# Altium footprint library 15-LEDs+LCD.PcbLib: 116 footprints (part 2 of 8) (continued)
## DS_EA_DOGXL160B-7 [mm] "160x104-Pixel  LCD Graphic Display With Blue Background" (continued)
3D body "DS_EA_DOGXL160B-7.stp": height 6.44, standoff -3.07, extent -39,-30.655 39,30.655

## DS_EA_LED78X64-W [mm] "White LED Backlight for 60x104-Pixel  LCD Graphic Display"
height 3.8
Top Overlay:
  lines w0.2: -39,-27.55 39,-27.55 ; -39,27.55 39,27.55 ; -39,28.55 39,28.55 ; -38.95,-28.55 39.05,-28.55 ; -39,-32 -39,32 39,32 39,-32 -39,-32
Mechanical 8:
  lines w0.1: -19.55,-30.48 -19.05,-30.48 ; -19.55,30.48 -19.05,30.48 ; -19.05,-30.98 -19.05,-30.48 ; -19.05,-29.98 -19.05,-30.48 ; -19.05,29.98 -19.05,30.48 ; -19.05,30.98 -19.05,30.48 ; -18.55,-30.48 -19.05,-30.48 ; -18.55,30.48 -19.05,30.48 ; -17.01,-30.48 -16.51,-30.48 ; -17.01,30.48 -16.51,30.48 ; -16.51,-30.98 -16.51,-30.48 ; -16.51,-29.98 -16.51,-30.48 ; -16.51,29.98 -16.51,30.48 ; -16.51,30.98 -16.51,30.48 ; -16.01,-30.48 -16.51,-30.48 ; -16.01,30.48 -16.51,30.48 ; -14.47,-30.48 -13.97,-30.48 ; -14.47,30.48 -13.97,30.48 ; -13.97,-30.98 -13.97,-30.48 ; -13.97,-29.98 -13.97,-30.48 ; -13.97,29.98 -13.97,30.48 ; -13.97,30.98 -13.97,30.48 ; -13.47,-30.48 -13.97,-30.48 ; -13.47,30.48 -13.97,30.48 ; -11.93,30.48 -11.43,30.48 ; -11.43,29.98 -11.43,30.48 ; -11.43,30.98 -11.43,30.48 ; -10.93,30.48 -11.43,30.48 ; -9.39,30.48 -8.89,30.48 ; -8.89,29.98 -8.89,30.48 ; -8.89,30.98 -8.89,30.48 ; -8.39,30.48 -8.89,30.48 ; -6.85,30.48 -6.35,30.48 ; -6.35,29.98 -6.35,30.48 ; -6.35,30.98 -6.35,30.48 ; -5.85,30.48 -6.35,30.48 ; -4.31,30.48 -3.81,30.48 ; -3.81,29.98 -3.81,30.48 ; -3.81,30.98 -3.81,30.48 ; -3.31,30.48 -3.81,30.48 ; -1.77,30.48 -1.27,30.48 ; -1.27,29.98 -1.27,30.48 ; -1.27,30.98 -1.27,30.48 ; -0.77,30.48 -1.27,30.48 ; -0.5,0 0,0 ; 0,-0.5 0,0 ; 0,0.5 0,0 ; 0.5,0 0,0 ; 0.77,30.48 1.27,30.48 ; 1.27,29.98 1.27,30.48 ; 1.27,30.98 1.27,30.48 ; 1.77,30.48 1.27,30.48 ; 3.31,30.48 3.81,30.48 ; 3.81,29.98 3.81,30.48 ; 3.81,30.98 3.81,30.48 ; 4.31,30.48 3.81,30.48 ; 5.85,30.48 6.35,30.48 ; 6.35,29.98 6.35,30.48 ; 6.35,30.98 6.35,30.48 ; 6.85,30.48 6.35,30.48 ; 8.39,30.48 8.89,30.48 ; 8.89,29.98 8.89,30.48 ; 8.89,30.98 8.89,30.48 ; 9.39,30.48 8.89,30.48 ; 10.93,30.48 11.43,30.48 ; 11.43,29.98 11.43,30.48 ; 11.43,30.98 11.43,30.48 ; 11.93,30.48 11.43,30.48 ; 13.47,-30.48 13.97,-30.48 ; 13.47,30.48 13.97,30.48 ; 13.97,-30.98 13.97,-30.48 ; 13.97,-29.98 13.97,-30.48 ; 13.97,29.98 13.97,30.48 ; 13.97,30.98 13.97,30.48 ; 14.47,-30.48 13.97,-30.48 ; 14.47,30.48 13.97,30.48 ; 16.01,-30.48 16.51,-30.48 ; 16.01,30.48 16.51,30.48 ; 16.51,-30.98 16.51,-30.48 ; 16.51,-29.98 16.51,-30.48 ; 16.51,29.98 16.51,30.48 ; 16.51,30.98 16.51,30.48 ; 17.01,-30.48 16.51,-30.48 ; 17.01,30.48 16.51,30.48 ; 18.55,-30.48 19.05,-30.48 ; 18.55,30.48 19.05,30.48 ; 19.05,-30.98 19.05,-30.48 ; 19.05,-29.98 19.05,-30.48 ; 19.05,29.98 19.05,30.48 ; 19.05,30.98 19.05,30.48 ; 19.55,-30.48 19.05,-30.48 ; 19.55,30.48 19.05,30.48
Mechanical 14:
  lines w0.1: -39,-27.55 39,-27.55 ; -39,27.55 39,27.55 ; -39,28.55 39,28.55 ; -38.95,-28.55 39.05,-28.55 ; -39,-32 -39,32 39,32 39,-32 -39,-32
3D body "DS_EA_LED78X64-W.stp": height 3.63, standoff 0, extent -39,-32 39,32

## DS_EA_TOUCH160-1 [mm] "Touch Panel For DOGXL160  LCD Graphic Display"
height 1.6
Top Overlay:
  lines w0.2: -26.5,30.67 -26.5,31.929 -25.484,31.33 -22.769,32.478 -21.6,31.929 -21.6,30.67 ; -20.4,30.67 -39,30.67 -39,-29.33 39,-29.33 39,30.67 20.4,30.67 ; -36.5,-25.83 -36.5,20.17 36.5,20.17 36.5,-25.83 -36.5,-25.83 ; -35,-24.58 35,-24.58 35,18.92 -35,18.92 -35,-24.58
Mechanical 8:
  lines w0.1: -35,-24.58 0,-2.83 ; -35,18.92 0,-2.83 ; -24.05,29.17 -24.05,30.17 ; -24.05,30.67 -24.05,31.17 ; -24.05,31.67 -24.05,32.67 ; -24.05,33.17 -24.05,33.67 ; -19.55,-30.48 -19.05,-30.48 ; -19.55,30.48 -19.05,30.48 ; -19.05,-30.98 -19.05,-30.48 ; -19.05,-29.98 -19.05,-30.48 ; -19.05,29.98 -19.05,30.48 ; -19.05,30.98 -19.05,30.48 ; -18.55,-30.48 -19.05,-30.48 ; -18.55,30.48 -19.05,30.48 ; -17.01,-30.48 -16.51,-30.48 ; -17.01,30.48 -16.51,30.48 ; -16.51,-30.98 -16.51,-30.48 ; -16.51,-29.98 -16.51,-30.48 ; -16.51,29.98 -16.51,30.48 ; -16.51,30.98 -16.51,30.48 ; -16.01,-30.48 -16.51,-30.48 ; -16.01,30.48 -16.51,30.48 ; -14.47,-30.48 -13.97,-30.48 ; -14.47,30.48 -13.97,30.48 ; -13.97,-30.98 -13.97,-30.48 ; -13.97,-29.98 -13.97,-30.48 ; -13.97,29.98 -13.97,30.48 ; -13.97,30.98 -13.97,30.48 ; -13.47,-30.48 -13.97,-30.48 ; -13.47,30.48 -13.97,30.48 ; -11.93,30.48 -11.43,30.48 ; -11.43,29.98 -11.43,30.48 ; -11.43,30.98 -11.43,30.48 ; -10.93,30.48 -11.43,30.48 ; -9.39,30.48 -8.89,30.48 ; -8.89,29.98 -8.89,30.48 ; -8.89,30.98 -8.89,30.48 ; -8.39,30.48 -8.89,30.48 ; -6.85,30.48 -6.35,30.48 ; -6.35,29.98 -6.35,30.48 ; -6.35,30.98 -6.35,30.48 ; -5.85,30.48 -6.35,30.48 ; -4.31,30.48 -3.81,30.48 ; -3.81,29.98 -3.81,30.48 ; -3.81,30.98 -3.81,30.48 ; -3.31,30.48 -3.81,30.48 ; -1.77,30.48 -1.27,30.48 ; -1.27,29.98 -1.27,30.48 ; -1.27,30.98 -1.27,30.48 ; -0.77,30.48 -1.27,30.48 ; -0.5,0 0,0 ; 0,-0.5 0,0 ; 0,0.5 0,0 ; 0.5,0 0,0 ; 0.77,30.48 1.27,30.48 ; 1.27,29.98 1.27,30.48 ; 1.27,30.98 1.27,30.48 ; 1.77,30.48 1.27,30.48 ; 3.31,30.48 3.81,30.48 ; 3.81,29.98 3.81,30.48 ; 3.81,30.98 3.81,30.48 ; 4.31,30.48 3.81,30.48 ; 5.85,30.48 6.35,30.48 ; 6.35,29.98 6.35,30.48 ; 6.35,30.98 6.35,30.48 ; 6.85,30.48 6.35,30.48 ; 8.39,30.48 8.89,30.48 ; 8.89,29.98 8.89,30.48 ; 8.89,30.98 8.89,30.48 ; 9.39,30.48 8.89,30.48 ; 10.93,30.48 11.43,30.48 ; 11.43,29.98 11.43,30.48 ; 11.43,30.98 11.43,30.48 ; 11.93,30.48 11.43,30.48 ; 13.47,-30.48 13.97,-30.48 ; 13.47,30.48 13.97,30.48 ; 13.97,-30.98 13.97,-30.48 ; 13.97,-29.98 13.97,-30.48 ; 13.97,29.98 13.97,30.48 ; 13.97,30.98 13.97,30.48 ; 14.47,-30.48 13.97,-30.48 ; 14.47,30.48 13.97,30.48 ; 16.01,-30.48 16.51,-30.48 ; 16.01,30.48 16.51,30.48 ; 16.51,-30.98 16.51,-30.48 ; 16.51,-29.98 16.51,-30.48 ; 16.51,29.98 16.51,30.48 ; 16.51,30.98 16.51,30.48 ; 17.01,-30.48 16.51,-30.48 ; 17.01,30.48 16.51,30.48 ; 18.55,-30.48 19.05,-30.48 ; 18.55,30.48 19.05,30.48 ; 19.05,-30.98 19.05,-30.48 ; 19.05,-29.98 19.05,-30.48 ; 19.05,29.98 19.05,30.48 ; 19.05,30.98 19.05,30.48 ; 19.55,-30.48 19.05,-30.48 ; 19.55,30.48 19.05,30.48 ; 35,-24.58 0,-2.83 ; 35,18.92 0,-2.83
Mechanical 14:
  lines w0.1: -26.5,30.67 -26.5,31.929 -25.484,31.33 -22.769,32.478 -21.6,31.929 -21.6,30.67 ; -39,-29.33 -39,30.67 39,30.67 39,-29.33 -39,-29.33 ; -36.5,-25.83 -36.5,20.17 36.5,20.17 36.5,-25.83 -36.5,-25.83 ; -35,-24.58 35,-24.58 35,18.92 -35,18.92 -35,-24.58
3D body "DS_EA_TOUCH160-1.stp": height 8.04, standoff 6.44, extent -39,-29.33 39,36.393

## DS_KINGBRIGHT_SA52-11SRWA [mm] "13.2mm Single Digit Numeric Red Display, Body 12.65x17.75mm"
height 7.25
pads (10):
  round 1.3 hole 0.8: 1(-5.08,-7.62) 2(-2.54,-7.62) 3(0,-7.62) 4(2.54,-7.62) 5(5.08,-7.62) 6(5.08,7.62) 7(2.54,7.62) 8(0,7.62) 9(-2.54,7.62) 10(-5.08,7.62)
Top Overlay:
  circle w0.2: c4.735,-5.9 r0.7
  lines w0.2: -6.325,-8.875 6.325,-8.875 6.325,8.875 -6.325,8.875 -6.325,-8.875 ; -4.982,-5.615 -4.101,-0.617 -3.508,-0.12 -2.751,-1.021 -3.454,-5.008 -4.649,-6.012 -4.982,-5.615 ; -4.489,-6.203 -4.156,-6.6 1.582,-6.6 2.073,-6.188 1.244,-5.2 -3.293,-5.2 -4.489,-6.203 ; -3.883,0.617 -3.002,5.615 -2.511,6.027 -1.682,5.039 -2.377,1.095 -3.472,0.127 -3.883,0.617 ; -3.264,-0.022 -2.694,-0.7 2.2,-0.7 3.017,0.022 2.447,0.7 -2.447,0.7 -3.264,-0.022 ; -2.32,6.188 -1.491,5.2 3.046,5.2 4.242,6.203 3.909,6.6 -1.828,6.6 -2.32,6.188 ; 1.435,-5.039 2.131,-1.095 3.225,-0.127 3.636,-0.617 2.755,-5.615 2.264,-6.027 1.435,-5.039 ; 2.504,1.021 3.207,5.008 4.403,6.012 4.735,5.615 3.854,0.617 3.261,0.12 2.504,1.021
Mechanical 8:
  lines w0.1: -5.53,-7.62 -5.08,-7.62 -5.08,-8.07 ; -5.53,7.62 -5.08,7.62 -5.08,7.17 ; -2.99,-7.62 -2.54,-7.62 -2.54,-8.07 ; -2.99,7.62 -2.54,7.62 -2.54,7.17 ; -1,0 1,0 ; -0.45,-7.62 0,-7.62 0,-8.07 ; -0.45,7.62 0,7.62 0,7.17 ; 0,-1 0,1 ; 2.09,-7.62 2.54,-7.62 2.54,-8.07 ; 2.09,7.62 2.54,7.62 2.54,7.17 ; 4.63,-7.62 5.08,-7.62 5.08,-8.07 ; 4.63,7.62 5.08,7.62 5.08,7.17 ; -5.33,-7.745 -4.83,-7.745 -4.83,-7.495 -5.33,-7.495 -5.33,-7.745 ; -5.33,7.495 -4.83,7.495 -4.83,7.745 -5.33,7.745 -5.33,7.495 ; -2.79,-7.745 -2.29,-7.745 -2.29,-7.495 -2.79,-7.495 -2.79,-7.745 ; -2.79,7.495 -2.29,7.495 -2.29,7.745 -2.79,7.745 -2.79,7.495 ; -0.25,-7.745 0.25,-7.745 0.25,-7.495 -0.25,-7.495 -0.25,-7.745 ; -0.25,7.495 0.25,7.495 0.25,7.745 -0.25,7.745 -0.25,7.495 ; 2.29,-7.745 2.79,-7.745 2.79,-7.495 2.29,-7.495 2.29,-7.745 ; 2.29,7.495 2.79,7.495 2.79,7.745 2.29,7.745 2.29,7.495 ; 4.83,-7.745 5.33,-7.745 5.33,-7.495 4.83,-7.495 4.83,-7.745 ; 4.83,7.495 5.33,7.495 5.33,7.745 4.83,7.745 4.83,7.495
Mechanical 14:
  circle w0.1: c4.735,-5.9 r0.7
  lines w0.1: -6.325,-8.875 6.325,-8.875 6.325,8.875 -6.325,8.875 -6.325,-8.875 ; -4.982,-5.615 -4.101,-0.617 -3.508,-0.12 -2.751,-1.021 -3.454,-5.008 -4.649,-6.012 -4.982,-5.615 ; -4.489,-6.203 -4.156,-6.6 1.582,-6.6 2.073,-6.188 1.244,-5.2 -3.293,-5.2 -4.489,-6.203 ; -3.883,0.617 -3.002,5.615 -2.511,6.027 -1.682,5.039 -2.377,1.095 -3.472,0.127 -3.883,0.617 ; -3.264,-0.022 -2.694,-0.7 2.2,-0.7 3.017,0.022 2.447,0.7 -2.447,0.7 -3.264,-0.022 ; -2.32,6.188 -1.491,5.2 3.046,5.2 4.242,6.203 3.909,6.6 -1.828,6.6 -2.32,6.188 ; 1.435,-5.039 2.131,-1.095 3.225,-0.127 3.636,-0.617 2.755,-5.615 2.264,-6.027 1.435,-5.039 ; 2.504,1.021 3.207,5.008 4.403,6.012 4.735,5.615 3.854,0.617 3.261,0.12 2.504,1.021
3D body "DS_KINGBRIGHT_SA52-11SRWA.stp": height 7.1, standoff -3.6, extent -6.325,-8.875 6.325,8.875

## DS_LASCAR_DPM160_a [mm] "4?Digit LCD Voltmeter With 12.5mm (0.5\") Digit Height"
height 13.6
Top Overlay:
  lines w0.2: -22.65,-8.15 -22.65,8.15 22.65,8.15 22.65,-8.15 ; -26,-12.5 -26,12.5 26,12.5 26,-12.5 -26,-12.5
  text "20" at -24.825,-10.175 h1
  text "1" at 23.942,-10.16 h1
Mechanical 8:
  lines w0.1: -24.63,-7.82 -24.13,-7.82 ; -24.13,-8.32 -24.13,-7.82 ; -24.13,-7.32 -24.13,-7.82 ; -23.63,-7.82 -24.13,-7.82 ; -22.09,-7.82 -21.59,-7.82 ; -21.59,-8.32 -21.59,-7.82 ; -21.59,-7.32 -21.59,-7.82 ; -21.09,-7.82 -21.59,-7.82 ; -19.55,-7.82 -19.05,-7.82 ; -19.05,-8.32 -19.05,-7.82 ; -19.05,-7.32 -19.05,-7.82 ; -18.55,-7.82 -19.05,-7.82 ; -17.01,-7.82 -16.51,-7.82 ; -16.51,-8.32 -16.51,-7.82 ; -16.51,-7.32 -16.51,-7.82 ; -16.01,-7.82 -16.51,-7.82 ; -14.47,-7.82 -13.97,-7.82 ; -13.97,-8.32 -13.97,-7.82 ; -13.97,-7.32 -13.97,-7.82 ; -13.47,-7.82 -13.97,-7.82 ; -11.93,-7.82 -11.43,-7.82 ; -11.43,-8.32 -11.43,-7.82 ; -11.43,-7.32 -11.43,-7.82 ; -10.93,-7.82 -11.43,-7.82 ; -9.39,-7.82 -8.89,-7.82 ; -8.89,-8.32 -8.89,-7.82 ; -8.89,-7.32 -8.89,-7.82 ; -8.39,-7.82 -8.89,-7.82 ; -6.85,-7.82 -6.35,-7.82 ; -6.35,-8.32 -6.35,-7.82 ; -6.35,-7.32 -6.35,-7.82 ; -5.85,-7.82 -6.35,-7.82 ; -4.31,-7.82 -3.81,-7.82 ; -3.81,-8.32 -3.81,-7.82 ; -3.81,-7.32 -3.81,-7.82 ; -3.31,-7.82 -3.81,-7.82 ; -1.77,-7.82 -1.27,-7.82 ; -1.27,-8.32 -1.27,-7.82 ; -1.27,-7.32 -1.27,-7.82 ; -0.77,-7.82 -1.27,-7.82 ; -0.5,0 0,0 ; 0,-0.5 0,0 ; 0,0.5 0,0 ; 0.5,0 0,0 ; 0.77,-7.82 1.27,-7.82 ; 1.27,-8.32 1.27,-7.82 ; 1.27,-7.32 1.27,-7.82 ; 1.77,-7.82 1.27,-7.82 ; 3.31,-7.82 3.81,-7.82 ; 3.81,-8.32 3.81,-7.82 ; 3.81,-7.32 3.81,-7.82 ; 4.31,-7.82 3.81,-7.82 ; 5.85,-7.82 6.35,-7.82 ; 6.35,-8.32 6.35,-7.82 ; 6.35,-7.32 6.35,-7.82 ; 6.85,-7.82 6.35,-7.82 ; 8.39,-7.82 8.89,-7.82 ; 8.89,-8.32 8.89,-7.82 ; 8.89,-7.32 8.89,-7.82 ; 9.39,-7.82 8.89,-7.82 ; 10.93,-7.82 11.43,-7.82 ; 11.43,-8.32 11.43,-7.82 ; 11.43,-7.32 11.43,-7.82 ; 11.93,-7.82 11.43,-7.82 ; 13.47,-7.82 13.97,-7.82 ; 13.97,-8.32 13.97,-7.82 ; 13.97,-7.32 13.97,-7.82 ; 14.47,-7.82 13.97,-7.82 ; 16.01,-7.82 16.51,-7.82 ; 16.51,-8.32 16.51,-7.82 ; 16.51,-7.32 16.51,-7.82 ; 17.01,-7.82 16.51,-7.82 ; 18.55,-7.82 19.05,-7.82 ; 19.05,-8.32 19.05,-7.82 ; 19.05,-7.32 19.05,-7.82 ; 19.55,-7.82 19.05,-7.82 ; 21.09,-7.82 21.59,-7.82 ; 21.59,-8.32 21.59,-7.82 ; 21.59,-7.32 21.59,-7.82 ; 22.09,-7.82 21.59,-7.82 ; 23.63,-7.82 24.13,-7.82 ; 24.13,-8.32 24.13,-7.82 ; 24.13,-7.32 24.13,-7.82 ; 24.63,-7.82 24.13,-7.82
Mechanical 14:
  lines w0.1: -22.7,6 -22.7,5 -21.7,5 ; -22.7,6.551 -24.3,6.551 -24.3,8.249 -22.7,8.249 ; -22.7,6.9 -22.7,7.9 ; -22.7,8.8 -22.7,9.8 -21.7,9.8 ; -20.7,5 -19.7,5 ; -20.7,9.8 -19.7,9.8 ; -18.7,5 -17.7,5 ; -18.7,9.8 -17.7,9.8 ; -16.7,5 -15.7,5 ; -16.7,9.8 -15.7,9.8 ; -14.7,5 -13.7,5 ; -14.7,9.8 -13.7,9.8 ; -12.7,5 -11.7,5 ; -12.7,9.8 -11.7,9.8 ; -10.7,5 -9.7,5 ; -10.7,9.8 -9.7,9.8 ; -8.7,5 -7.7,5 ; -8.7,9.8 -7.7,9.8 ; -6.7,5 -5.7,5 ; -6.7,9.8 -5.7,9.8 ; -5,5 -4,5 -4,6 ; -5,9.8 -4,9.8 -4,8.8 ; -4,6.9 -4,7.9 ; -26,-12.5 26,-12.5 ; -26,-12.5 -26,12.5 ; -26,-12.5 -26,12.5 ; -26,-12.5 26,-12.5 ; -26,12.5 26,12.5 ; -26,12.5 26,12.5 ; -22.65,-8.15 22.65,-8.15 ; -22.65,-8.15 -22.65,8.15 22.65,8.15 22.65,-8.15 ; -22.65,-8.15 22.65,-8.15 ; 26,-12.5 26,12.5 ; 26,-12.5 26,12.5
  text "20" at -24.825,-10.175 h1
  text "1" at 23.942,-10.16 h1
3D body "DS_LASCAR_DPM160.stp": height 13.3, standoff -1.6, extent -26,-12.5 26,12.5

## DS_LASCAR_OEM 1L-LED [mm] "3?Digit LED, 8mm Digit Height, Body 23.4x19.5mm, DIL Pin Connection"
height 5.4
pads (13):
  round 1.3 hole 0.8: 1(-6.35,-6.35) 2(-3.81,-6.35) 3(-1.27,-6.35) 4(1.27,-6.35) 5(3.81,-6.35) 6(6.35,-6.35) 7(6.35,6.35) 8(3.81,6.35) 9(1.27,6.35) 10(-1.27,6.35) 11(-3.81,6.35) 12(-6.35,6.35)
  round 1 hole 2 unplated mask+0.6: 13(6.7,-2.7)
Top Overlay:
  circle w0.3: c-6.38,-8.7 r0.15
  circle w0.3: c-0.25,-3.8 r0.15
  circle w0.3: c4.925,-3.8 r0.15
  circle w0.3: c-5.425,-3.8 r0.15
  region: -6.638,-3.4 -6.451,-0.4 -6.05,-0.4 -6.238,-3.4
  region: -4.538,-3.4 -4.137,-3.4 -3.949,-0.4 -4.35,-0.4
  region: -1.463,-3.4 -1.062,-3.4 -0.875,-0.4 -1.276,-0.4
  region: -4.174,-4 -4.149,-3.6 -1.476,-3.6 -1.501,-4
  region: -3.937,-0.2 -3.912,0.2 -1.238,0.2 -1.263,-0.2
  region: -9.112,-0.2 -9.087,0.2 -6.413,0.2 -6.438,-0.2
  region: -6.401,0.4 -6,0.4 -5.813,3.4 -6.213,3.4
  region: -4.113,3.4 -3.712,3.4 -3.899,0.4 -4.3,0.4
  region: -3.699,3.6 -3.674,4 -1.001,4 -1.026,3.6
  region: -1.038,3.4 -0.637,3.4 -0.825,0.4 -1.226,0.4
  region: 0.875,0.4 1.276,0.4 1.463,3.4 1.062,3.4
  region: 1.476,3.6 4.149,3.6 4.174,4 1.501,4
  region: 1.263,0.2 3.937,0.2 3.912,-0.2 1.238,-0.2
  region: 0.825,-0.4 1.226,-0.4 1.038,-3.4 0.637,-3.4
  region: 1.026,-3.6 3.699,-3.6 3.674,-4 1.001,-4
  region: 3.712,-3.4 4.113,-3.4 4.3,-0.4 3.899,-0.4
  region: 6,-0.4 6.401,-0.4 6.327,-1.578 5.926,-1.58
  region: 7.45,-3.6 8.874,-3.6 8.849,-4 7.4,-4
  region: 8.887,-3.4 9.288,-3.4 9.475,-0.4 9.074,-0.4
  region: 6.413,-0.2 6.438,0.2 9.112,0.2 9.087,-0.2
  region: 9.124,0.4 9.525,0.4 9.713,3.4 9.312,3.4
  region: 6.651,3.6 6.676,4 9.349,4 9.324,3.6
  region: 6.238,3.4 6.638,3.4 6.451,0.4 6.05,0.4
  region: 4.137,3.4 4.538,3.4 4.35,0.4 3.949,0.4
  lines w0.2: -11.7,-8.2 11.7,-8.2 11.7,8.2 -11.7,8.2 -11.7,-8.2
Mechanical 8:
  drawing of 237 lines, arcs and shapes, not listed
Mechanical 14:
  circle w0.3: c-5.425,-3.8 r0.15
  circle w0.3: c4.925,-3.8 r0.15
  circle w0.3: c-0.25,-3.8 r0.15
  region: -6.638,-3.4 -6.451,-0.4 -6.05,-0.4 -6.238,-3.4
  region: -4.538,-3.4 -4.137,-3.4 -3.949,-0.4 -4.35,-0.4
  region: -1.463,-3.4 -1.062,-3.4 -0.875,-0.4 -1.276,-0.4
  region: -4.174,-4 -4.149,-3.6 -1.476,-3.6 -1.501,-4
  region: -3.937,-0.2 -3.912,0.2 -1.238,0.2 -1.263,-0.2
  region: -9.112,-0.2 -9.087,0.2 -6.413,0.2 -6.438,-0.2
  region: -6.401,0.4 -6,0.4 -5.813,3.4 -6.213,3.4
  region: -4.113,3.4 -3.712,3.4 -3.899,0.4 -4.3,0.4
  region: -3.699,3.6 -3.674,4 -1.001,4 -1.026,3.6
  region: -1.038,3.4 -0.637,3.4 -0.825,0.4 -1.226,0.4
  region: 0.875,0.4 1.276,0.4 1.463,3.4 1.062,3.4
  region: 1.476,3.6 4.149,3.6 4.174,4 1.501,4
  region: 1.263,0.2 3.937,0.2 3.912,-0.2 1.238,-0.2
  region: 0.825,-0.4 1.226,-0.4 1.038,-3.4 0.637,-3.4
  region: 1.026,-3.6 3.699,-3.6 3.674,-4 1.001,-4
  region: 3.712,-3.4 4.113,-3.4 4.3,-0.4 3.899,-0.4
  region: 6,-0.4 6.401,-0.4 6.213,-3.4 5.813,-3.4
  region: 6.201,-3.6 8.874,-3.6 8.849,-4 6.176,-4
  region: 8.887,-3.4 9.288,-3.4 9.475,-0.4 9.074,-0.4
  region: 6.413,-0.2 6.438,0.2 9.112,0.2 9.087,-0.2
  region: 9.124,0.4 9.525,0.4 9.713,3.4 9.312,3.4
  region: 6.651,3.6 6.676,4 9.349,4 9.324,3.6
  region: 6.238,3.4 6.638,3.4 6.451,0.4 6.05,0.4
  region: 4.137,3.4 4.538,3.4 4.35,0.4 3.949,0.4
  lines w0.1: -11.7,-8.2 11.7,-8.2 11.7,8.2 -11.7,8.2 -11.7,-8.2
3D body "DS_LASCAR_OEM 1L-LED.stp": height 5.4, standoff -3.1, extent -11.7,-8.2 11.7,8.2

## DS_MURATA_DMS-40LCD-1/2-5-C [mm] "4 1/2 Digit, LCD Display Digital Panel Voltmeters, Body 55.1x23.4mm"
height 10.92
pads (13):
  round 1.8 hole 1.1: 1(-22.85,6.35) 2(-22.85,3.81) 3(-22.85,1.27) 4(-22.85,-1.27) 5(-22.85,-3.81) 6(-22.85,-6.35) 7(22.85,-6.35) 8(22.85,-3.81) 9(22.85,-1.27) 10(22.85,1.27) 11(22.85,3.81) 12(22.85,6.35)
  round 1 hole 3.2 unplated mask+1.1: 13(14.59,1.02)
Top Overlay:
  drawing of 191 lines, arcs and shapes, not listed
Mechanical 8:
  lines w0.1: -23.35,-6.35 -22.85,-6.35 ; -23.35,-3.81 -22.85,-3.81 ; -23.35,-1.27 -22.85,-1.27 ; -23.35,1.27 -22.85,1.27 ; -23.35,3.81 -22.85,3.81 ; -23.35,6.35 -22.85,6.35 ; -22.85,-6.85 -22.85,-6.35 ; -22.85,-5.85 -22.85,-6.35 ; -22.85,-4.31 -22.85,-3.81 ; -22.85,-3.31 -22.85,-3.81 ; -22.85,-1.77 -22.85,-1.27 ; -22.85,-0.77 -22.85,-1.27 ; -22.85,0.77 -22.85,1.27 ; -22.85,1.77 -22.85,1.27 ; -22.85,3.31 -22.85,3.81 ; -22.85,4.31 -22.85,3.81 ; -22.85,5.85 -22.85,6.35 ; -22.85,6.85 -22.85,6.35 ; -22.35,-6.35 -22.85,-6.35 ; -22.35,-3.81 -22.85,-3.81 ; -22.35,-1.27 -22.85,-1.27 ; -22.35,1.27 -22.85,1.27 ; -22.35,3.81 -22.85,3.81 ; -22.35,6.35 -22.85,6.35 ; -0.5,0 0,0 ; 0,-0.5 0,0 ; 0,0.5 0,0 ; 0.5,0 0,0 ; 14.09,1.02 14.59,1.02 ; 14.59,0.52 14.59,1.02 ; 14.59,1.52 14.59,1.02 ; 15.09,1.02 14.59,1.02 ; 22.35,-6.35 22.85,-6.35 ; 22.35,-3.81 22.85,-3.81 ; 22.35,-1.27 22.85,-1.27 ; 22.35,1.27 22.85,1.27 ; 22.35,3.81 22.85,3.81 ; 22.35,6.35 22.85,6.35 ; 22.85,-6.85 22.85,-6.35 ; 22.85,-5.85 22.85,-6.35 ; 22.85,-4.31 22.85,-3.81 ; 22.85,-3.31 22.85,-3.81 ; 22.85,-1.77 22.85,-1.27 ; 22.85,-0.77 22.85,-1.27 ; 22.85,0.77 22.85,1.27 ; 22.85,1.77 22.85,1.27 ; 22.85,3.31 22.85,3.81 ; 22.85,4.31 22.85,3.81 ; 22.85,5.85 22.85,6.35 ; 22.85,6.85 22.85,6.35 ; 23.35,-6.35 22.85,-6.35 ; 23.35,-3.81 22.85,-3.81 ; 23.35,-1.27 22.85,-1.27 ; 23.35,1.27 22.85,1.27 ; 23.35,3.81 22.85,3.81 ; 23.35,6.35 22.85,6.35
Mechanical 14:
  drawing of 195 lines, arcs and shapes, not listed
3D body "DS_MURATA_DMS-40LCD-1-2-5-C.stp": height 10.92, standoff -3.58, extent -27.55,-11.7 27.55,11.7

## DS_POWERTIP_PC1202LRS-AWA-B [mm] "Alphanumeric LCD Display Module, 2 x 12 characters, Dot Size:0.45 x 0.60, Dot Pitch 0.55 x 0.70, With LED Backlight Yellow-Green"
height 12.8
Top Overlay:
  lines w0.2: -28.1,-16.25 -28.1,16.25 -16.85,16.25 -16.85,15 ccw(c-15.6,15) -14.35,15 -14.35,16.25 14.35,16.25 14.35,15 ccw(c15.6,15) 16.85,15 16.85,16.25 28.1,16.25 28.1,-16.25 16.85,-16.25 16.85,-15 ccw(c15.6,-15) 14.35,-15 14.35,-16.25 -14.35,-16.25 -14.35,-15 ccw(c-15.6,-15) -16.85,-15 -16.85,-16.25 -28.1,-16.25 ; -25.65,-12.35 25.65,-12.35 25.65,12.35 -25.65,12.35 -25.65,-12.35 ; -23.25,-8.75 23.25,-8.75 23.25,8.75 -23.25,8.75 -23.25,-8.75 ; -18.925,-5.85 -18.925,-0.35 -16.275,-0.35 -16.275,-5.85 -18.925,-5.85 ; -18.925,0.35 -18.925,5.85 -16.275,5.85 -16.275,0.35 -18.925,0.35 ; -15.725,-5.85 -13.075,-5.85 -13.075,-0.35 -15.725,-0.35 -15.725,-5.85 ; -15.725,0.35 -13.075,0.35 -13.075,5.85 -15.725,5.85 -15.725,0.35 ; -12.525,-5.85 -9.875,-5.85 -9.875,-0.35 -12.525,-0.35 -12.525,-5.85 ; -12.525,0.35 -9.875,0.35 -9.875,5.85 -12.525,5.85 -12.525,0.35 ; -9.325,-5.85 -6.675,-5.85 -6.675,-0.35 -9.325,-0.35 -9.325,-5.85 ; -9.325,0.35 -6.675,0.35 -6.675,5.85 -9.325,5.85 -9.325,0.35 ; -6.125,-5.85 -3.475,-5.85 -3.475,-0.35 -6.125,-0.35 -6.125,-5.85 ; -6.125,0.35 -3.475,0.35 -3.475,5.85 -6.125,5.85 -6.125,0.35 ; -2.925,-5.85 -0.275,-5.85 -0.275,-0.35 -2.925,-0.35 -2.925,-5.85 ; -2.925,0.35 -0.275,0.35 -0.275,5.85 -2.925,5.85 -2.925,0.35 ; 0.275,-5.85 2.925,-5.85 2.925,-0.35 0.275,-0.35 0.275,-5.85 ; 0.275,0.35 2.925,0.35 2.925,5.85 0.275,5.85 0.275,0.35 ; 3.475,-5.85 6.125,-5.85 6.125,-0.35 3.475,-0.35 3.475,-5.85 ; 3.475,0.35 6.125,0.35 6.125,5.85 3.475,5.85 3.475,0.35 ; 6.675,-5.85 9.325,-5.85 9.325,-0.35 6.675,-0.35 6.675,-5.85 ; 6.675,0.35 9.325,0.35 9.325,5.85 6.675,5.85 6.675,0.35 ; 9.875,-5.85 12.525,-5.85 12.525,-0.35 9.875,-0.35 9.875,-5.85 ; 9.875,0.35 12.525,0.35 12.525,5.85 9.875,5.85 9.875,0.35 ; 13.075,-5.85 15.725,-5.85 15.725,-0.35 13.075,-0.35 13.075,-5.85 ; 13.075,0.35 15.725,0.35 15.725,5.85 13.075,5.85 13.075,0.35 ; 16.275,-5.85 18.925,-5.85 18.925,-0.35 16.275,-0.35 16.275,-5.85 ; 16.275,0.35 18.925,0.35 18.925,5.85 16.275,5.85 16.275,0.35
  text "K" at 26.592,2.035 h1
  text "A" at 26.592,-3.045 h1
  text "15" at 10.717,-15.11 h1
  text "1" at -11.008,-15.135 h1
Mechanical 8:
  lines w0.1: -16.1,-15 -15.6,-15 ; -16.1,15 -15.6,15 ; -15.6,-15.5 -15.6,-15 ; -15.6,-14.5 -15.6,-15 ; -15.6,14.5 -15.6,15 ; -15.6,15.5 -15.6,15 ; -15.1,-15 -15.6,-15 ; -15.1,15 -15.6,15 ; -9.39,-14.75 -8.89,-14.75 ; -8.89,-15.25 -8.89,-14.75 ; -8.89,-14.25 -8.89,-14.75 ; -8.39,-14.75 -8.89,-14.75 ; -8.12,-14.75 -7.62,-14.75 ; -7.62,-15.25 -7.62,-14.75 ; -7.62,-14.25 -7.62,-14.75 ; -7.12,-14.75 -7.62,-14.75 ; -6.85,-14.75 -6.35,-14.75 ; -6.35,-15.25 -6.35,-14.75 ; -6.35,-14.25 -6.35,-14.75 ; -5.85,-14.75 -6.35,-14.75 ; -5.58,-14.75 -5.08,-14.75 ; -5.08,-15.25 -5.08,-14.75 ; -5.08,-14.25 -5.08,-14.75 ; -4.58,-14.75 -5.08,-14.75 ; -4.31,-14.75 -3.81,-14.75 ; -3.81,-15.25 -3.81,-14.75 ; -3.81,-14.25 -3.81,-14.75 ; -3.31,-14.75 -3.81,-14.75 ; -3.04,-14.75 -2.54,-14.75 ; -2.54,-15.25 -2.54,-14.75 ; -2.54,-14.25 -2.54,-14.75 ; -2.04,-14.75 -2.54,-14.75 ; -1.77,-14.75 -1.27,-14.75 ; -1.27,-15.25 -1.27,-14.75 ; -1.27,-14.25 -1.27,-14.75 ; -0.77,-14.75 -1.27,-14.75 ; -0.5,-14.75 0,-14.75 ; -0.5,0 0,0 ; 0,-15.25 0,-14.75 ; 0,-14.25 0,-14.75 ; 0,-0.5 0,0 ; 0,0.5 0,0 ; 0.5,-14.75 0,-14.75 ; 0.5,0 0,0 ; 0.77,-14.75 1.27,-14.75 ; 1.27,-15.25 1.27,-14.75 ; 1.27,-14.25 1.27,-14.75 ; 1.77,-14.75 1.27,-14.75 ; 2.04,-14.75 2.54,-14.75 ; 2.54,-15.25 2.54,-14.75 ; 2.54,-14.25 2.54,-14.75 ; 3.04,-14.75 2.54,-14.75 ; 3.31,-14.75 3.81,-14.75 ; 3.81,-15.25 3.81,-14.75 ; 3.81,-14.25 3.81,-14.75 ; 4.31,-14.75 3.81,-14.75 ; 4.58,-14.75 5.08,-14.75 ; 5.08,-15.25 5.08,-14.75 ; 5.08,-14.25 5.08,-14.75 ; 5.58,-14.75 5.08,-14.75 ; 5.85,-14.75 6.35,-14.75 ; 6.35,-15.25 6.35,-14.75 ; 6.35,-14.25 6.35,-14.75 ; 6.85,-14.75 6.35,-14.75 ; 7.12,-14.75 7.62,-14.75 ; 7.62,-15.25 7.62,-14.75 ; 7.62,-14.25 7.62,-14.75 ; 8.12,-14.75 7.62,-14.75 ; 8.39,-14.75 8.89,-14.75 ; 8.89,-15.25 8.89,-14.75 ; 8.89,-14.25 8.89,-14.75 ; 9.39,-14.75 8.89,-14.75 ; 15.1,-15 15.6,-15 ; 15.1,15 15.6,15 ; 15.6,-15.5 15.6,-15 ; 15.6,-14.5 15.6,-15 ; 15.6,14.5 15.6,15 ; 15.6,15.5 15.6,15 ; 16.1,-15 15.6,-15 ; 16.1,15 15.6,15 ; 26.1,-4.5 26.6,-4.5 ; 26.1,4.5 26.6,4.5 ; 26.6,-5 26.6,-4.5 ; 26.6,-4 26.6,-4.5 ; 26.6,4 26.6,4.5 ; 26.6,5 26.6,4.5 ; 27.1,-4.5 26.6,-4.5 ; 27.1,4.5 26.6,4.5
Mechanical 14:
  lines w0.1: -28.1,-16.25 -28.1,16.25 -16.85,16.25 -16.85,15 ccw(c-15.6,15) -14.35,15 -14.35,16.25 14.35,16.25 14.35,15 ccw(c15.6,15) 16.85,15 16.85,16.25 28.1,16.25 28.1,-16.25 16.85,-16.25 16.85,-15 ccw(c15.6,-15) 14.35,-15 14.35,-16.25 -14.35,-16.25 -14.35,-15 ccw(c-15.6,-15) -16.85,-15 -16.85,-16.25 -28.1,-16.25 ; -25.65,-12.35 25.65,-12.35 25.65,12.35 -25.65,12.35 -25.65,-12.35 ; -23.25,-8.75 23.25,-8.75 23.25,8.75 -23.25,8.75 -23.25,-8.75 ; -18.925,-5.85 -18.925,-0.35 -16.275,-0.35 -16.275,-5.85 -18.925,-5.85 ; -18.925,0.35 -18.925,5.85 -16.275,5.85 -16.275,0.35 -18.925,0.35 ; -15.725,-5.85 -13.075,-5.85 -13.075,-0.35 -15.725,-0.35 -15.725,-5.85 ; -15.725,0.35 -13.075,0.35 -13.075,5.85 -15.725,5.85 -15.725,0.35 ; -12.525,-5.85 -9.875,-5.85 -9.875,-0.35 -12.525,-0.35 -12.525,-5.85 ; -12.525,0.35 -9.875,0.35 -9.875,5.85 -12.525,5.85 -12.525,0.35 ; -9.325,-5.85 -6.675,-5.85 -6.675,-0.35 -9.325,-0.35 -9.325,-5.85 ; -9.325,0.35 -6.675,0.35 -6.675,5.85 -9.325,5.85 -9.325,0.35 ; -6.125,-5.85 -3.475,-5.85 -3.475,-0.35 -6.125,-0.35 -6.125,-5.85 ; -6.125,0.35 -3.475,0.35 -3.475,5.85 -6.125,5.85 -6.125,0.35 ; -2.925,-5.85 -0.275,-5.85 -0.275,-0.35 -2.925,-0.35 -2.925,-5.85 ; -2.925,0.35 -0.275,0.35 -0.275,5.85 -2.925,5.85 -2.925,0.35 ; 0.275,-5.85 2.925,-5.85 2.925,-0.35 0.275,-0.35 0.275,-5.85 ; 0.275,0.35 2.925,0.35 2.925,5.85 0.275,5.85 0.275,0.35 ; 3.475,-5.85 6.125,-5.85 6.125,-0.35 3.475,-0.35 3.475,-5.85 ; 3.475,0.35 6.125,0.35 6.125,5.85 3.475,5.85 3.475,0.35 ; 6.675,-5.85 9.325,-5.85 9.325,-0.35 6.675,-0.35 6.675,-5.85 ; 6.675,0.35 9.325,0.35 9.325,5.85 6.675,5.85 6.675,0.35 ; 9.875,-5.85 12.525,-5.85 12.525,-0.35 9.875,-0.35 9.875,-5.85 ; 9.875,0.35 12.525,0.35 12.525,5.85 9.875,5.85 9.875,0.35 ; 13.075,-5.85 15.725,-5.85 15.725,-0.35 13.075,-0.35 13.075,-5.85 ; 13.075,0.35 15.725,0.35 15.725,5.85 13.075,5.85 13.075,0.35 ; 16.275,-5.85 18.925,-5.85 18.925,-0.35 16.275,-0.35 16.275,-5.85 ; 16.275,0.35 18.925,0.35 18.925,5.85 16.275,5.85 16.275,0.35
  text "K" at 26.592,2.035 h1
  text "A" at 26.592,-3.045 h1
  text "15" at 10.717,-15.11 h1
  text "1" at -11.008,-15.135 h1
3D body "DS_POWERTIP_PC1202LRS-AWA-B.stp": height 12.8, standoff 0, extent -28.1,-16.25 28.1,16.25

## EL357N [mm]
height 12.8
pads (4):
  rect 1.5x0.6 smd: 1(-3.175,1.27) 2(-3.175,-1.27) 3(3.175,-1.27) 4(3.175,1.27)
Top Overlay:
  circle w0.254: c-3.175,2.286 r0.178
  lines w0.127: -2.3,-2.05 2.3,-2.05 ; -2.3,2.05 2.3,2.05
3D body "el357n.stp": height 2, standoff 0, extent -3.7,-2.05 3.7,2.05